# Altium footprint library MODULE_IMX.PcbLib: 1 footprints
Each footprint in its own frame and in the unit in brackets; x right, y up, seen from the top. Pads: shape width x height; smd on the part's side, far side on the other; paste and mask are expansions set on the pad; w line width, h text height; cw(c..) or ccw(c..) is an arc to the next point about the centre after c.
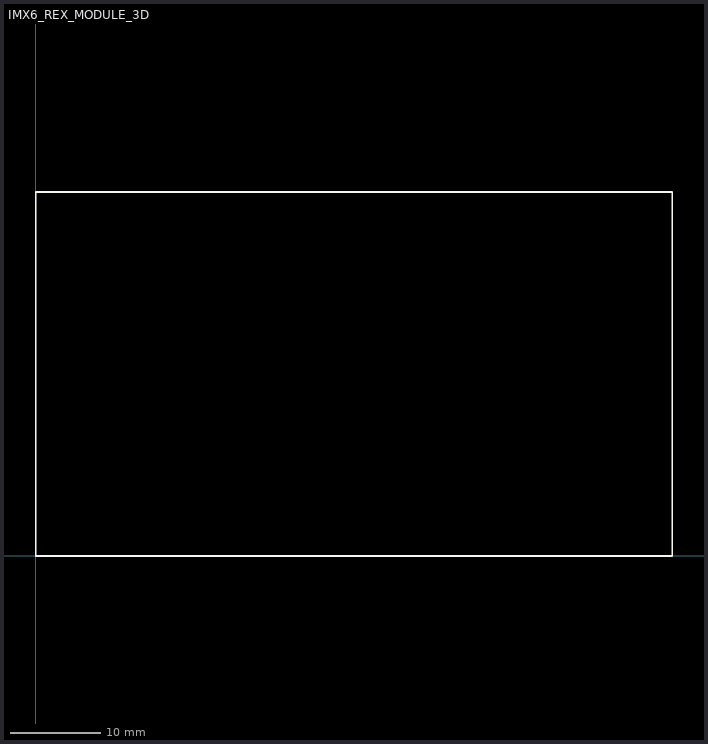
[diagram p0: the footprint, top view; thin cyan lines are the x and y axes]

## IMX6_REX_MODULE_3D [mm]
Top Overlay:
  lines w0.2: 0,0 69.977,0 69.977,40.005 0,40.005 0,0
3D body "iMX6 Rex_V1I1_PCB(Prototype) - 18-OCT-2013.step": height 9.6, standoff 1.61, extent 0,0 70,40